# Altium footprint library 2.52-直插元件.PcbLib: 467 footprints (part 5 of 30)
Each footprint in its own frame and in the unit in brackets; x right, y up, seen from the top. Pads: shape width x height; smd on the part's side, far side on the other; paste and mask are expansions set on the pad; w line width, h text height; cw(c..) or ccw(c..) is an arc to the next point about the centre after c.
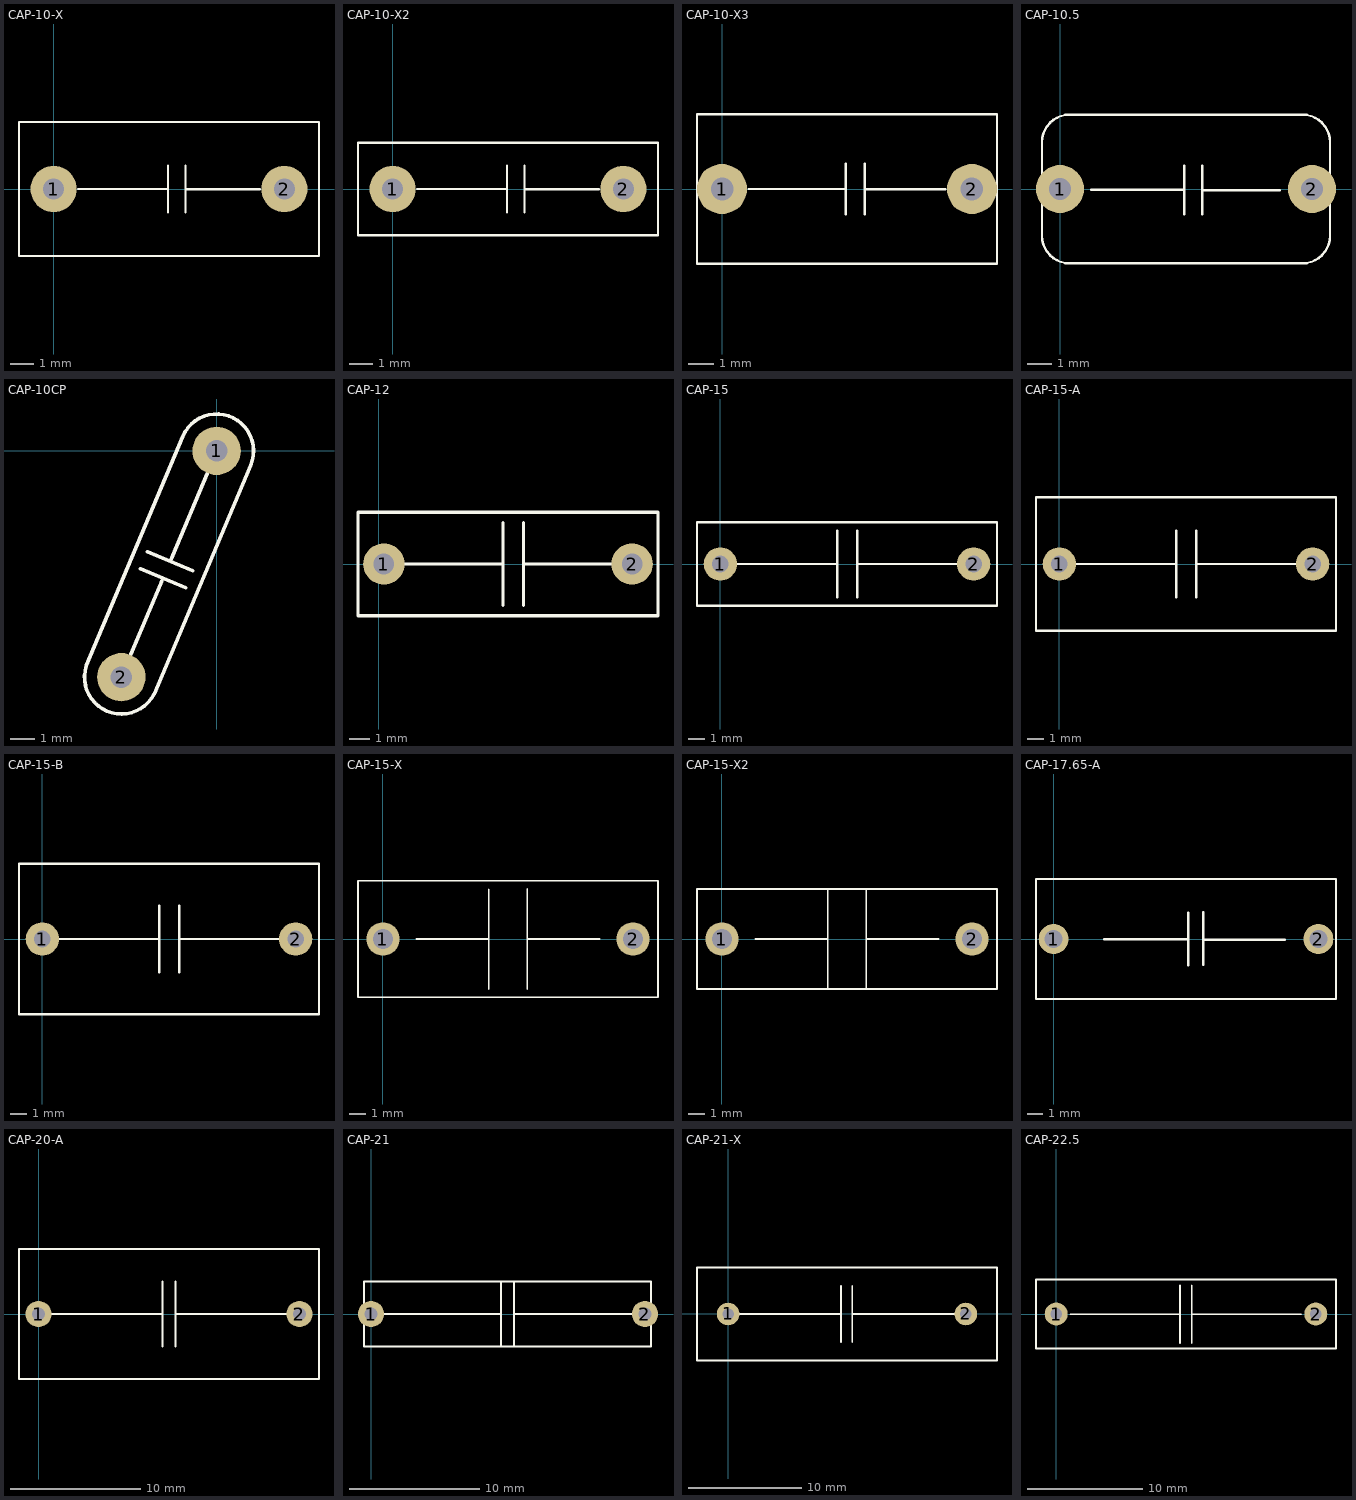
[diagram p4: the footprints below, top view; thin cyan lines are the x and y axes]

## CAP-10-X [mm] "淘宝ID:黄晶宝石   店铺网址:https://shop463601444.taobao.com"
pads (2):
  round 2 hole 0.9: 1(0,0) 2(10,0)
Top Overlay:
  lines w0.1: 1.072,0 4.953,0.003 ; 4.953,-1.016 4.953,1.016 ; 5.715,-1.016 5.715,1.016 ; 5.715,-0.007 8.939,-0.007 ; -1.5,-2.9 11.5,-2.9 11.5,2.9 -1.5,2.9 -1.5,-2.9
3D body "User Library-B81122-C1472-M.step": height 12, standoff -1.5, extent -1.5,-3 11.5,3

## CAP-10-X2 [mm]
pads (2):
  round 2 hole 0.9: 1(0,0) 2(10,0)
Top Overlay:
  lines w0.1: 1.072,0 4.953,0.003 ; 4.953,-1.016 4.953,1.016 ; 5.715,-1.016 5.715,1.016 ; 5.715,-0.007 8.939,-0.007 ; -1.5,-2 11.5,-2 11.5,2 -1.5,2 -1.5,-2
3D body "User Library-MKS4(H9).step": height 9, standoff -1.5, extent -1.5,-2 11.5,2

## CAP-10-X3 [mm]
pads (2):
  round 2 hole 0.9: 1(0,0) 2(10,0)
Top Overlay:
  lines w0.1: 1.072,0 4.953,0.003 ; 4.953,-1.016 4.953,1.016 ; 5.715,-1.016 5.715,1.016 ; 5.715,-0.007 8.939,-0.007 ; -1,-3 11,-3 11,3 -1,3 -1,-3
3D body "User Library-K73-17(12_6_10).step": height 11.5, standoff -1.5, extent -1,-3 11,3

## CAP-10.5 [mm]
pads (2):
  round 2 hole 0.9: 1(0,0) 2(10.5,0)
Top Overlay:
  lines w0.1: 0.403,-3.1 cw(c0.403,-1.947) -0.75,-1.947 -0.75,1.947 cw(c0.403,1.947) 0.403,3.1 10.097,3.1 cw(c10.097,1.947) 11.25,1.947 11.25,-1.947 cw(c10.097,-1.947) 10.097,-3.1 0.423,-3.1 ; 1.291,-0.037 5.172,-0.034 ; 5.172,-1.053 5.172,0.979 ; 5.934,-1.053 5.934,0.979 ; 5.934,-0.044 9.158,-0.044
3D body "电?": height 14.65, standoff -3.65, extent -0.75,-3.1 11.25,3.1

## CAP-10CP [mm]
pads (2):
  round 2 hole 0.9: 1(0,0) 2(-3.942,-9.364)
Top Overlay:
  lines w0.15: -5.394,-8.885 -1.405,0.591 cw(c0,0) 1.405,-0.591 -2.585,-10.067 ; -5.391,-8.891 ccw(c-3.942,-9.364) -2.591,-10.07 ; -3.548,-8.428 -2.316,-5.501 -2.267,-5.384 ; -3.154,-4.873 -1.281,-5.661 ; -2.858,-4.171 -0.985,-4.959 ; -1.922,-4.565 -1.823,-4.331 -0.394,-0.936
3D body "User Library-440LD68.STEP": height 23.43, standoff -3, extent -4.995,-13.888 1.005,4.412

## CAP-12 [mm]
pads (2):
  round 2 hole 1: 1(0.25,0) 2(12.25,0)
Top Overlay:
  lines w0.15: 0,0 6,0 ; 6,-2 6,2 ; 7,-2 7,2 ; 7,0 13,0 ; -1,-2.5 -1,2.5 13.5,2.5 13.5,-2.5 -1,-2.5
3D body "User Library-SV07AC104KAA.step": height 12.7, standoff -31.75, extent -0.989,-2.54 13.489,2.54

## CAP-15 [mm]
pads (2):
  round 2 hole 1: 1(0,0) 2(15.2,0)
Top Overlay:
  lines w0.15: 0,0 7,0 ; 7,-2 7,2 ; 8.2,-2 8.2,2 ; 8.2,0 15.2,0 ; -1.4,-2.5 16.6,-2.5 16.6,2.5 -1.4,2.5 -1.4,-2.5
3D body "User Library-MKP10(P15)(B5)(H11).step": height 11, standoff -1.5, extent -1.4,-2.5 16.6,2.5

## CAP-15-A [mm]
pads (2):
  round 2 hole 1: 1(0,0) 2(15.2,0)
Top Overlay:
  lines w0.15: 0,0 7,0 ; 7,-2 7,2 ; 8.2,-2 8.2,2 ; 8.2,0 15.2,0 ; -1.4,-4 16.6,-4 16.6,4 -1.4,4 -1.4,-4
3D body "User Library-K73-17(18_8_15).step": height 16.5, standoff -1.5, extent -1.4,-4 16.6,4
3D body "User Library-WIMA Capacitor.step": height 15, standoff -2.5, extent -1.4,-4 16.6,4

## CAP-15-B [mm]
pads (2):
  round 2 hole 1: 1(0,0) 2(15.2,0)
Top Overlay:
  lines w0.15: 0,0 7,0 ; 7,-2 7,2 ; 8.2,-2 8.2,2 ; 8.2,0 15.2,0 ; -1.4,-4.5 -1.4,4.5 16.6,4.5 16.6,-4.5 -1.4,-4.5
3D body "User Library-K73-17(18_8_15).STEP": height 15, standoff -2.5, extent -1.4,-4.5 16.6,4.5

## CAP-15-X [mm]
pads (2):
  round 2 hole 1.2: 1(0,0) 2(15,0)
Top Overlay:
  lines w0.1: 2,0 6.35,0 ; 6.35,-3 6.35,2.977 ; 8.65,-3 8.65,3 ; 8.65,0 13,0 ; -1.5,-3.5 16.5,-3.5 16.5,3.5 -1.5,3.5 -1.5,-3.5
3D body "User Library-MKT(15_17x18x7).step": height 13.5, standoff -2, extent -1.5,-3.505 16.5,3.505

## CAP-15-X2 [mm] "淘宝ID:黄晶宝石   店铺网址:https://shop463601444.taobao.com"
pads (2):
  round 2 hole 1.2: 1(0,0) 2(15,0)
Top Overlay:
  lines w0.1: 2,0 6.35,0 ; 6.327,3 6.35,2.977 6.35,-3 ; 8.65,-3 8.65,3 ; 8.65,0 13,0 ; -1.5,-3 -1.5,3 16.5,3 16.5,-3 -1.5,-3
3D body "User Library-WIMA Capacitor.step": height 12, standoff -2.5, extent -1.5,-3 16.5,3

## CAP-17.65-A [mm]
pads (2):
  round 2 hole 1.2: 1(0,0) 2(17.65,0)
Top Overlay:
  lines w0.15: 3.38,-0.013 7.382,-0.013 8.96,-0.013 ; 8.975,-1.752 8.975,1.769 ; 9.969,-1.722 9.969,1.798 ; 10.042,-0.043 15.419,-0.043 ; -1.175,-4 18.825,-4 18.825,4 -1.175,4 -1.175,-4
3D body "User Library-K73-17(20_8_17).step": height 16, standoff -1.5, extent -1.175,-4 18.825,4

## CAP-20-A [mm]
pads (2):
  round 2 hole 1: 1(0,0) 2(20,0)
Top Overlay:
  lines w0.15: 0,0 9.5,0 ; 9.5,-2.5 9.5,2.5 ; 10.5,-2.5 10.5,2.5 ; 10.5,0 20,0 ; -1.5,-5 21.5,-5 21.5,5 -1.5,5 -1.5,-5
3D body "User Library-K73-17(23_10_20).step": height 22, standoff -2, extent -1.501,-5 21.499,5

## CAP-21 [mm]
pads (2):
  round 2 hole 1: 1(0,0) 2(21,0)
Top Overlay:
  lines w0.15: 0.477,0.002 9.977,0.002 ; 9.977,-2.498 9.977,2.502 ; 10.977,-2.498 10.977,2.502 ; 10.977,0.002 20.477,0.002 ; -0.524,-2.498 21.476,-2.498 21.476,2.502 -0.524,2.502 -0.524,-2.498
3D body "CAP-21.STEP": height 13, standoff -4, extent -0.524,-2.498 21.476,2.502

## CAP-21-X [mm]
pads (2):
  round 2 hole 1: 1(0,0) 2(21,0)
Top Overlay:
  lines w0.15: 0.477,0.002 9.977,0.002 ; 9.977,-2.498 9.977,2.502 ; 10.977,-2.498 10.977,2.502 ; 10.977,0.002 20.477,0.002 ; -2.749,-4.1 -2.749,4.1 23.751,4.1 23.751,-4.1 -2.749,-4.1
3D body "CAP-21-X2.STEP": height 17, standoff -1.5, extent -2.749,-4.1 23.751,4.1

## CAP-22.5 [mm]
pads (2):
  round 2 hole 1: 1(0,0) 2(22.5,0)
Top Overlay:
  lines w0.15: 1.237,-0.023 10.737,-0.023 ; 10.737,-2.523 10.737,2.477 ; 11.737,-2.523 11.737,2.477 ; 11.737,-0.023 21.237,-0.023 ; -1.75,-3 24.25,-3 24.25,3 -1.75,3 -1.75,-3
3D body "MKT(22_5_26x15x6).step": height 16, standoff -2, extent -1.75,-3.005 24.25,3.005